# Altium footprint library 14-Inductors.PcbLib: 164 footprints (part 7 of 11) (continued)
## IND_WURTH_WE-CMB-XXL [mm] "WURTH Common Mode Choke WE-CMB XXL Serie" (continued)
  text "4" at -5.3,12.15 h1.5
  text "3" at 4.7,12.15 h1.5
  text "2" at 4.8,-13.6 h1.5
  text "1" at -5.2,-13.6 h1.5
3D body "IND_WURTH_WE-CMB-XXL.stp": height 39.4, standoff -5, extent -19.6,-11.5 19.6,11.5

## IND_WURTH_WE-DD_7332 [mm] "Power Choke, WE-DD Serie, Body 7.7x7.7mm"
height 4
pads (4):
  rect 2.2x1 smd: 1(-2.65,-0.9) 2(2.65,-0.9) 3(2.65,0.9) 4(-2.65,0.9)
Top Overlay:
  circle w0.2: c-1.05,-1.4 r0.1
  lines w0.2: -3.85,-1.75 -3.85,-3.35 ccw(c-3.35,-3.35) -3.35,-3.85 3.35,-3.85 ccw(c3.35,-3.35) 3.85,-3.35 3.85,-1.75 ; -3.85,1.75 -3.85,3.35 cw(c-3.35,3.35) -3.35,3.85 3.35,3.85 cw(c3.35,3.35) 3.85,3.35 3.85,1.75 ; -2.855,-1.75 -2.951,-1.875 ccw(c-2.872,-1.936) -2.943,-2.007 -2.007,-2.943 ccw(c-1.936,-2.872) -1.875,-2.951 -1.322,-2.525 ; -2.855,1.75 -2.951,1.875 cw(c-2.872,1.936) -2.943,2.007 -2.007,2.943 cw(c-1.936,2.872) -1.875,2.951 -1.322,2.525 ; -1.855,-1.75 ccw(c0,0) 1.855,-1.75 ; -1.855,1.75 cw(c0,0) 1.855,1.75 ; -1.322,-2.18 -1.322,-2.525 ; -1.322,2.18 -1.322,2.525 ; -1.2,-0.9 -1.05,-0.9 cw(c-0.7,-0.9) -0.35,-0.9 cw(c0,-0.9) 0.35,-0.9 cw(c0.7,-0.9) 1.05,-0.9 1.2,-0.9 ; -1.2,0.9 -1.05,0.9 ccw(c-0.7,0.9) -0.35,0.9 ccw(c0,0.9) 0.35,0.9 ccw(c0.7,0.9) 1.05,0.9 1.2,0.9 ; -1.05,-0.2 -0.75,-0.2 ; -1.05,0.2 -0.75,0.2 ; -0.45,-0.2 -0.15,-0.2 ; -0.45,0.2 -0.15,0.2 ; 0.15,-0.2 0.45,-0.2 ; 0.15,0.2 0.45,0.2 ; 0.75,-0.2 1.05,-0.2 ; 0.75,0.2 1.05,0.2 ; 1.322,-2.18 1.322,-2.525 ; 1.322,2.18 1.322,2.525 ; 2.855,-1.75 2.951,-1.875 cw(c2.872,-1.936) 2.943,-2.007 2.007,-2.943 cw(c1.936,-2.872) 1.875,-2.951 1.322,-2.525 ; 2.855,1.75 2.951,1.875 ccw(c2.872,1.936) 2.943,2.007 2.007,2.943 ccw(c1.936,2.872) 1.875,2.951 1.322,2.525 ; -1.322,-2.525 ccw(c0,0) 1.322,-2.525 ; -1.322,2.525 cw(c0,0) 1.322,2.525
Mechanical 8:
  lines w0.05: -2.65,-1.4 -2.65,-0.9 -2.15,-0.9 ; -2.65,0.4 -2.65,0.9 -2.15,0.9 ; 0,-0.5 0,0 0.5,0 ; 2.65,-1.4 2.65,-0.9 3.15,-0.9 ; 2.65,0.4 2.65,0.9 3.15,0.9
Mechanical 14:
  circle w0.1: c0,0 r2.65
  circle w0.1: c-1.5,-1.5 r0.25
  lines w0.1: -2.296,-1.322 -2.525,-1.322 ; -2.296,1.322 -2.525,1.322 ; -1.322,-2.296 -1.322,-2.525 ; -1.322,2.296 -1.322,2.525 ; -1.2,-0.9 -1.05,-0.9 cw(c-0.7,-0.9) -0.35,-0.9 cw(c0,-0.9) 0.35,-0.9 cw(c0.7,-0.9) 1.05,-0.9 1.2,-0.9 ; -1.2,0.9 -1.05,0.9 ccw(c-0.7,0.9) -0.35,0.9 ccw(c0,0.9) 0.35,0.9 ccw(c0.7,0.9) 1.05,0.9 1.2,0.9 ; -1.05,-0.2 -0.75,-0.2 ; -1.05,0.2 -0.75,0.2 ; -0.45,-0.2 -0.15,-0.2 ; -0.45,0.2 -0.15,0.2 ; 0.15,-0.2 0.45,-0.2 ; 0.15,0.2 0.45,0.2 ; 0.75,-0.2 1.05,-0.2 ; 0.75,0.2 1.05,0.2 ; 1.322,-2.296 1.322,-2.525 ; 1.322,2.296 1.322,2.525 ; 2.296,-1.322 2.525,-1.322 ; 2.296,1.322 2.525,1.322 ; -2.525,-1.322 cw(c0,0) -2.525,1.322 ; -2.525,-1.322 -2.951,-1.875 ccw(c-2.872,-1.936) -2.943,-2.007 -2.007,-2.943 ccw(c-1.936,-2.872) -1.875,-2.951 -1.322,-2.525 ; -2.525,1.322 -2.951,1.875 cw(c-2.872,1.936) -2.943,2.007 -2.007,2.943 cw(c-1.936,2.872) -1.875,2.951 -1.322,2.525 ; -1.322,-2.525 ccw(c0,0) 1.322,-2.525 ; -1.322,2.525 cw(c0,0) 1.322,2.525 ; 1.322,-2.525 1.875,-2.951 ccw(c1.936,-2.872) 2.007,-2.943 2.943,-2.007 ccw(c2.872,-1.936) 2.951,-1.875 2.525,-1.322 ; 1.322,2.525 1.875,2.951 cw(c1.936,2.872) 2.007,2.943 2.943,2.007 cw(c2.872,1.936) 2.951,1.875 2.525,1.322 ; 2.525,-1.322 ccw(c0,0) 2.525,1.322 ; -3.85,-3.35 ccw(c-3.35,-3.35) -3.35,-3.85 3.35,-3.85 ccw(c3.35,-3.35) 3.85,-3.35 3.85,3.35 ccw(c3.35,3.35) 3.35,3.85 -3.35,3.85 ccw(c-3.35,3.35) -3.85,3.35 -3.85,-3.35
Mechanical 15:
  lines w0.05: -0.3,0 0.3,0 ; 0,-0.3 0,0.3 ; -4.1,-4.1 -4.1,4.1 4.1,4.1 4.1,-4.1 -4.1,-4.1
3D body "IND_WURTH_WE-DD-7332.stp": height 4, standoff 0, extent -3.65,-3.65 3.65,3.65

## IND_WURTH_WE-PD3_S [mm] "SMD Power Choke, Width 4.45mm Body Lenght 6.6mm Height 2.92mm, WURTH WE-PD3 Serie"
height 2.92
pads (2):
  rect 1.4x3.56 smd: 1(-2.725,0) 2(2.725,0)
Top Overlay:
  lines w0.2: -1.73,-1.993 -1.462,-2.225 1.462,-2.225 1.73,-1.993 ; -1.73,-1.19 ccw(c0,0) 1.73,-1.19 ; -1.73,-0.497 ccw(c0,0) 1.73,-0.497 ; -1.73,0.497 cw(c0,0) 1.73,0.497 ; -1.73,1.19 cw(c0,0) 1.73,1.19 ; -1.73,1.993 -1.462,2.225 1.462,2.225 1.73,1.993
Mechanical 8:
  lines w0.1: -3.23,0 -2.73,0 ; -2.73,-0.5 -2.73,0 ; -2.73,0.5 -2.73,0 ; -2.23,0 -2.73,0 ; -0.5,0 0,0 ; 0,-0.5 0,0 ; 0,0.5 0,0 ; 0.5,0 0,0 ; 2.23,0 2.73,0 ; 2.73,-0.5 2.73,0 ; 2.73,0.5 2.73,0 ; 3.23,0 2.73,0
Mechanical 14:
  circle w0.1: c0,0 r1.8
  circle w0.1: c0,0 r1.9
  circle w0.1: c0,0 r2.1
  lines w0.1: -2.3,-1.5 -1.462,-2.225 1.462,-2.225 2.3,-1.5 ; -2.3,-1.5 -2.3,1.5 ; -2.3,-1.5 -3.3,-0.635 -3.3,0.635 -2.3,1.5 ; -2.3,1.5 -1.462,2.225 1.462,2.225 2.3,1.5 ; 2.3,-1.5 3.3,-0.635 3.3,0.635 2.3,1.5 ; 2.3,-1.5 2.3,1.5
Mechanical 15:
  lines w0.05: -3.68,-2.475 3.68,-2.475 3.68,2.475 -3.68,2.475 -3.68,-2.475
3D body "IND_WURTH_WE-PD3-S.stp": height 2.92, standoff 0, extent -3.3,-2.225 3.3,2.225

## IND_WURTH_WE-PD4_L [mm] "SMD Power Choke, Width 10mm Body Lenght 12.7mm Height 5.3mm, WURTH WE-PD 4 Serie Type L"
height 5.3
pads (2):
  rect 3x2.8 smd: 1(-5.15,0) 2(5.15,0)
Top Overlay:
  circle w0.2: c-2.5,0 r0.35
  lines w0.2: -5.948,-1.8 -2.99,-4.007 ccw(c0,0) 2.99,-4.007 5.948,-1.8 ; -5.948,1.8 -2.99,4.007 cw(c0,0) 2.99,4.007 5.948,1.8 ; -3.811,-1.8 ccw(c0,0) 3.811,-1.8 ; -3.811,1.8 cw(c0,0) 3.811,1.8
Mechanical 8:
  lines w0.1: -5.65,0 -5.15,0 ; -5.15,-0.5 -5.15,0 ; -5.15,0.5 -5.15,0 ; -4.65,0 -5.15,0 ; -0.5,0 0,0 ; 0,-0.5 0,0 ; 0,0.5 0,0 ; 0.5,0 0,0 ; 4.65,0 5.15,0 ; 5.15,-0.5 5.15,0 ; 5.15,0.5 5.15,0 ; 5.65,0 5.15,0 ; -6.65,-1.4 -3.65,-1.4 -3.65,1.4 -6.65,1.4 -6.65,-1.4 ; 3.65,-1.4 6.65,-1.4 6.65,1.4 3.65,1.4 3.65,-1.4
Mechanical 14:
  circle w0.1: c-2.5,0 r0.35
  circle w0.1: c0,0 r4.215
  lines w0.1: -6.2,-1 -6.2,1 ; -4.196,-0.4 -3.815,-0.4 ccw(c-3.815,0) -3.815,0.4 -4.196,0.4 ; -4.095,-1 -6.35,-1 -6.35,-1.5 -2.99,-4.007 ccw(c0,0) 2.99,-4.007 6.35,-1.5 6.35,-1 4.095,-1 ; -4.095,1 -6.35,1 -6.35,1.5 -2.99,4.007 cw(c0,0) 2.99,4.007 6.35,1.5 6.35,1 4.095,1 ; 4.196,-0.4 3.815,-0.4 cw(c3.815,0) 3.815,0.4 4.196,0.4 ; 6.2,-1 6.2,1
Mechanical 15:
  lines w0.1: -6.9,-1.65 -6.567,-1.65 -3.14,-4.208 ccw(c0,0) 3.14,-4.208 6.567,-1.65 6.9,-1.65 6.9,1.65 6.567,1.65 3.14,4.208 ccw(c0,0) -3.14,4.208 -6.567,1.65 -6.9,1.65 -6.9,-1.65
3D body "IND_WURTH_WE-PD4-L.stp": height 5, standoff 0, extent -6.35,-5 6.35,5

## IND_WURTH_WE-PD4_XL [mm] "SMD Power Choke, Body Width 15mm Body Lenght 15mm Height 7.8mm, WURTH WE-PD 4 Serie Type XL"
height 7.8
pads (2):
  rect 4x9 smd: 1(-8.75,0) 2(8.75,0)
Top Overlay:
  circle w0.2: c-2.395,-2.099 r0.5
  circle w0.2: c0,0 r6.35
  lines w0.2: -6.214,-4.9 -2.552,-7.464 ccw(c-2.437,-7.3) -2.437,-7.5 2.437,-7.5 ccw(c2.437,-7.3) 2.552,-7.464 6.214,-4.9 ; -6.214,4.9 -2.552,7.464 cw(c-2.437,7.3) -2.437,7.5 2.437,7.5 cw(c2.437,7.3) 2.552,7.464 6.214,4.9
Mechanical 8:
  lines w0.1: -9.25,0 -8.75,0 ; -8.75,-0.5 -8.75,0 ; -8.75,0.5 -8.75,0 ; -8.25,0 -8.75,0 ; -0.5,0 0,0 ; 0,-0.5 0,0 ; 0,0.5 0,0 ; 0.5,0 0,0 ; 8.25,0 8.75,0 ; 8.75,-0.5 8.75,0 ; 8.75,0.5 8.75,0 ; 9.25,0 8.75,0 ; -10.75,-4.5 -6.75,-4.5 -6.75,4.5 -10.75,4.5 -10.75,-4.5 ; 6.75,-4.5 10.75,-4.5 10.75,4.5 6.75,4.5 6.75,-4.5
Mechanical 14:
  circle w0.1: c-2.395,-2.099 r0.5
  circle w0.1: c0,0 r6.75
  lines w0.1: -9.8,-3 -10,-3 -10,-3.5 cw(c-10.5,-3.5) -11,-3.5 -11,-2.2 cw(c-10.5,-2.2) -10.852,-1.845 -10.059,-1.059 ccw(c-10.2,-0.917) -10,-0.917 -10,0.917 ccw(c-10.2,0.917) -10.059,1.059 -10.852,1.845 cw(c-10.5,2.2) -11,2.2 -11,3.5 cw(c-10.5,3.5) -10,3.5 -10,3 -9.8,3 ; -7.5,-3.896 ccw(c-7.3,-3.896) -7.415,-4.06 -2.552,-7.464 ccw(c-2.437,-7.3) -2.437,-7.5 2.437,-7.5 ccw(c2.437,-7.3) 2.552,-7.464 7.415,-4.06 ccw(c7.3,-3.896) 7.5,-3.896 ; -7.5,3.896 cw(c-7.3,3.896) -7.415,4.06 -2.552,7.464 cw(c-2.437,7.3) -2.437,7.5 2.437,7.5 cw(c2.437,7.3) 2.552,7.464 7.415,4.06 cw(c7.3,3.896) 7.5,3.896 ; 9.8,-3 10,-3 10,-3.5 ccw(c10.5,-3.5) 11,-3.5 11,-2.2 ccw(c10.5,-2.2) 10.852,-1.845 10.059,-1.059 cw(c10.2,-0.917) 10,-0.917 10,0.917 cw(c10.2,0.917) 10.059,1.059 10.852,1.845 ccw(c10.5,2.2) 11,2.2 11,3.5 ccw(c10.5,3.5) 10,3.5 10,3 9.8,3 ; -9.8,-4 -9.8,4 -7.5,4 -7.5,-4 -9.8,-4 ; 7.5,-4 7.5,4 9.8,4 9.8,-4 7.5,-4
Mechanical 15:
  lines w0.1: -11.25,-4.75 -6.865,-4.75 -2.579,-7.75 2.579,-7.75 6.865,-4.75 11.25,-4.75 11.25,4.75 6.865,4.75 2.579,7.75 -2.579,7.75 -6.865,4.75 -11.25,4.75 -11.25,-4.75
3D body "IND_WURTH_WE-PD4-XL.stp": height 7, standoff 0, extent -11,-7.5 11,7.5

## IND_WURTH_WE-PD-XSH [mm] "Power-Choke Inductor, Body 6.2x5.9mm, WURTH WE-PD Serie Type XSH"
height 5.1
pads (2):
  rect 1.85x1.9 smd: 1(-2.175,0) 2(2.175,0)
Top Overlay:
  lines w0.2: -2.95,-1.3 -2.95,-1.8 ccw(c-1.65,-1.8) -1.65,-3.1 1.65,-3.1 ccw(c1.65,-1.8) 2.95,-1.8 2.95,-1.3 ; -2.95,1.3 -2.95,1.8 cw(c-1.65,1.8) -1.65,3.1 1.65,3.1 cw(c1.65,1.8) 2.95,1.8 2.95,1.3
Mechanical 8:
  lines w0.1: -2.675,0 -2.175,0 ; -2.175,-0.5 -2.175,0 ; -2.175,0.5 -2.175,0 ; -1.675,0 -2.175,0 ; -0.5,0 0,0 ; 0,-0.5 0,0 ; 0,0.5 0,0 ; 0.5,0 0,0 ; 1.675,0 2.175,0 ; 2.175,-0.5 2.175,0 ; 2.175,0.5 2.175,0 ; 2.675,0 2.175,0 ; -3.1,-0.95 -1.25,-0.95 -1.25,0.95 -3.1,0.95 -3.1,-0.95 ; 1.25,-0.95 3.1,-0.95 3.1,0.95 1.25,0.95 1.25,-0.95
Mechanical 14:
  lines w0.1: -2.95,-1.8 ccw(c-1.65,-1.8) -1.65,-3.1 1.65,-3.1 ccw(c1.65,-1.8) 2.95,-1.8 2.95,1.8 ccw(c1.65,1.8) 1.65,3.1 -1.65,3.1 ccw(c-1.65,1.8) -2.95,1.8 -2.95,-1.8
Mechanical 15:
  lines w0.05: -3.35,-3.35 3.35,-3.35 3.35,3.35 -3.35,3.35 -3.35,-3.35
3D body "IND_WURTH_WE-PD-XSH.stp": height 5.1, standoff 0, extent -2.95,-3.1 2.95,3.1

## IND_WURTH_WE-PD_7332(METAL) [mm] "Power Choke, WE-PD Serie, Body 7.3x7.3mm (Metal Base)"
height 3.4
pads (2):
  rect 1.6x2.2 smd: 1(-3.2,0) 2(3.2,0)
Top Overlay:
  circle w0.2: c-2.35,2.35 r0.4
  lines w0.2: -3.65,-1.5 -3.65,-2.35 ccw(c-2.35,-2.35) -2.35,-3.65 2.35,-3.65 ccw(c2.35,-2.35) 3.65,-2.35 3.65,-1.5 ; -3.65,1.5 -3.65,2.35 cw(c-2.35,2.35) -2.35,3.65 2.35,3.65 cw(c2.35,2.35) 3.65,2.35 3.65,1.5
Mechanical 8:
  lines w0.1: -3.7,0 -3.2,0 ; -3.2,-0.5 -3.2,0 ; -3.2,0.5 -3.2,0 ; -2.7,0 -3.2,0 ; -0.5,0 0,0 ; 0,-0.5 0,0 ; 0,0.5 0,0 ; 0.5,0 0,0 ; 2.7,0 3.2,0 ; 3.2,-0.5 3.2,0 ; 3.2,0.5 3.2,0 ; 3.7,0 3.2,0 ; -2.4,-1.1 -2.4,1.1 ; -2.4,-1.1 -2.4,1.1 ; -2.4,-1.1 -4,-1.1 -4,1.1 -2.4,1.1 ; 4,-1.1 4,1.1 ; 4,-1.1 4,1.1 ; 4,-1.1 2.4,-1.1 2.4,1.1 4,1.1
Mechanical 14:
  circle w0.1: c-2.35,2.35 r0.4
  lines w0.1: -3.65,-2.35 ccw(c-2.35,-2.35) -2.35,-3.65 2.35,-3.65 ccw(c2.35,-2.35) 3.65,-2.35 3.65,2.35 ccw(c2.35,2.35) 2.35,3.65 -2.35,3.65 ccw(c-2.35,2.35) -3.65,2.35 -3.65,-2.35
Mechanical 15:
  lines w0.05: -4.25,-3.9 4.25,-3.9 4.25,3.9 -4.25,3.9 -4.25,-3.9
3D body "IND_WURTH_WE-PD_7332(METAL).stp": height 3.4, standoff 0, extent -3.65,-3.65 3.65,3.65

## IND_WURTH_WE-PD_XXL [mm] "Power-Choke Inductor, Body 12x12mm, WURTH WE-PD Serie Type XXL"
height 10
pads (2):
  rect 2.9x5.4 smd: 1(-4.95,0) 2(4.95,0)
Top Overlay:
  circle w0.2: c-2.51,-2.86 r0.4
  lines w0.2: -6.25,-3 -6.25,-5.25 ccw(c-5.25,-5.25) -5.25,-6.25 5.25,-6.25 ccw(c5.25,-5.25) 6.25,-5.25 6.25,-3 ; -6.25,3 -6.25,5.25 cw(c-5.25,5.25) -5.25,6.25 5.25,6.25 cw(c5.25,5.25) 6.25,5.25 6.25,3 ; -5.113,-3 ccw(c-3.96,-3.96) -2.767,-4.869 ; -5.113,3 cw(c-3.96,3.96) -2.767,4.869 ; -4.729,-3 ccw(c0,0) 4.729,-3 ; -4.729,3 cw(c0,0) 4.729,3 ; -4.369,-3 ccw(c0,0) 4.369,-3 ; -4.369,3 cw(c0,0) 4.369,3 ; 2.767,-4.869 ccw(c3.96,-3.96) 5.113,-3 ; 2.767,4.869 cw(c3.96,3.96) 5.113,3
Mechanical 8:
  lines w0.1: -5.45,0 -4.95,0 ; -4.95,-0.5 -4.95,0 ; -4.95,0.5 -4.95,0 ; -4.45,0 -4.95,0 ; -0.5,0 0,0 ; 0,-0.5 0,0 ; 0,0.5 0,0 ; 0.5,0 0,0 ; 4.45,0 4.95,0 ; 4.95,-0.5 4.95,0 ; 4.95,0.5 4.95,0 ; 5.45,0 4.95,0 ; -3.5,-2.7 -6.4,-2.7 -6.4,2.7 -3.5,2.7 ; -3.5,-2.7 -3.5,2.7 ; -3.5,-2.7 -3.5,2.7 ; 3.5,-2.7 3.5,2.7 ; 3.5,-2.7 6.4,-2.7 6.4,2.7 3.5,2.7 ; 3.5,-2.7 3.5,2.7
Mechanical 14:
  circle w0.1: c0,0 r5.6
  circle w0.1: c0,0 r5.3
  circle w0.1: c-2.51,-2.86 r0.4
  lines w0.1: -4.869,-2.767 ccw(c-3.96,-3.96) -2.767,-4.869 ; -4.869,2.767 cw(c-3.96,3.96) -2.767,4.869 ; 2.767,-4.869 ccw(c3.96,-3.96) 4.869,-2.767 ; 2.767,4.869 cw(c3.96,3.96) 4.869,2.767 ; -6.25,-5.25 ccw(c-5.25,-5.25) -5.25,-6.25 5.25,-6.25 ccw(c5.25,-5.25) 6.25,-5.25 6.25,5.25 ccw(c5.25,5.25) 5.25,6.25 -5.25,6.25 ccw(c-5.25,5.25) -6.25,5.25 -6.25,-5.25
Mechanical 15:
  lines w0.1: -6.65,-6.5 6.65,-6.5 6.65,6.5 -6.65,6.5 -6.65,-6.5
3D body "IND_WURTH_WE-PD-XXL.stp": height 10, standoff 0, extent -6.25,-6.25 6.25,6.25

## IND_WURTH_WE-PMI-0805 [mm] "Chip Inductor, EIA 0805, Metric 2012, Body 2.0x1.2mm, WE-PMI Serie"
height 1.2
pads (2):
  rect 0.7x1.45 smd: 1(-0.75,0) 2(0.75,0)
Top Overlay:
  lines w0.2: 0,-0.6 0,0.6
Mechanical 8:
  lines w0.1: -1.25,0 -0.75,0 ; -0.75,-0.5 -0.75,0 ; -0.75,0.5 -0.75,0 ; -0.5,0 0,0 ; 0,-0.5 0,0 ; 0,0.5 0,0 ; 0.5,0 0,0 ; 0.75,-0.5 0.75,0 ; 0.75,0.5 0.75,0 ; 1.25,0 0.75,0 ; -1.1,-0.725 -0.4,-0.725 -0.4,0.725 -1.1,0.725 -1.1,-0.725 ; 0.4,-0.725 1.1,-0.725 1.1,0.725 0.4,0.725 0.4,-0.725
Mechanical 14:
  lines w0.1: -1,-0.6 1,-0.6 1,0.6 -1,0.6 -1,-0.6
Mechanical 15:
  lines w0.05: -1.35,-0.975 1.35,-0.975 1.35,0.975 -1.35,0.975 -1.35,-0.975
3D body "IND_WURTH_WE-PMI-0805.stp": height 1, standoff 0, extent -1,-0.6 1,0.6

## IND_WURTH_WE-SD_744711015 [mm] "WURTH Filter Choke WE-SD Serie"
height 16
pads (2):
  round 2.7 hole 2: 1(-14.6,7.15) 2(14.6,-7.15)
Top Overlay:
  lines w0.2: -15.4,5.594 -15.4,-6 -14.241,-6 ; -14.978,5.441 -14.167,-7.148 ccw(c-13.317,-7.15) -12.469,-7.089 ; -13.357,5.918 -12.468,-7.095 ; -13.013,7.888 cw(c-12.591,7.15) -11.741,7.15 -10.768,-7.095 ; -12.467,-7.15 ccw(c-11.617,-7.15) -10.769,-7.089 ; -11.733,7.032 cw(c-10.891,7.15) -10.041,7.15 -9.068,-7.095 ; -10.767,-7.15 ccw(c-9.917,-7.15) -9.069,-7.089 ; -10.033,7.032 cw(c-9.191,7.15) -8.341,7.15 -7.368,-7.095 ; -9.067,-7.15 ccw(c-8.217,-7.15) -7.369,-7.089 ; -8.302,7.032 cw(c-7.46,7.151) -6.61,7.151 -5.638,-7.095 ; -7.336,-7.149 ccw(c-6.486,-7.149) -5.638,-7.088 ; -6.602,7.032 cw(c-5.76,7.151) -4.91,7.151 -3.938,-7.095 ; -5.636,-7.149 ccw(c-4.786,-7.149) -3.938,-7.088 ; -4.902,7.032 cw(c-4.06,7.151) -3.21,7.151 -2.238,-7.095 ; -3.936,-7.149 ccw(c-3.086,-7.149) -2.238,-7.088 ; -3.202,7.032 cw(c-2.36,7.151) -1.51,7.151 -0.538,-7.095 ; -2.236,-7.149 ccw(c-1.386,-7.149) -0.538,-7.088 ; -1.502,7.032 cw(c-0.66,7.151) 0.19,7.151 1.162,-7.095 ; -0.536,-7.149 ccw(c0.314,-7.149) 1.162,-7.088 ; 0.198,7.032 cw(c1.04,7.151) 1.89,7.151 2.862,-7.095 ; 1.164,-7.149 ccw(c2.014,-7.149) 2.862,-7.088 ; 1.898,7.032 cw(c2.74,7.151) 3.59,7.151 4.562,-7.095 ; 2.864,-7.149 ccw(c3.714,-7.149) 4.562,-7.088 ; 3.629,7.033 cw(c4.47,7.151) 5.32,7.151 6.293,-7.094 ; 4.595,-7.149 ccw(c5.445,-7.149) 6.292,-7.088 ; 5.329,7.033 cw(c6.17,7.151) 7.02,7.151 7.993,-7.094 ; 6.295,-7.149 ccw(c7.145,-7.149) 7.992,-7.088 ; 7.029,7.033 cw(c7.87,7.151) 8.72,7.151 9.693,-7.094 ; 7.995,-7.149 ccw(c8.845,-7.149) 9.692,-7.088 ; 8.729,7.033 cw(c9.57,7.151) 10.42,7.151 11.393,-7.094 ; 9.695,-7.149 ccw(c10.545,-7.149) 11.392,-7.088 ; 10.429,7.033 cw(c11.27,7.151) 12.12,7.151 13.042,-6.353 ; 11.395,-7.149 ccw(c12.245,-7.149) 12.925,-7.658 ; 12.129,7.033 cw(c12.97,7.151) 13.82,7.151 14.698,-5.403 ; 13.901,6 15.4,6 15.4,-5.594
Mechanical 8:
  lines w0.1: -15.1,7.15 -14.6,7.15 ; -14.6,6.65 -14.6,7.15 ; -14.6,7.65 -14.6,7.15 ; -14.1,7.15 -14.6,7.15 ; -0.5,0 0,0 ; 0,-0.5 0,0 ; 0,0.5 0,0 ; 0.5,0 0,0 ; 14.1,-7.15 14.6,-7.15 ; 14.6,-7.65 14.6,-7.15 ; 14.6,-6.65 14.6,-7.15 ; 15.1,-7.15 14.6,-7.15
Mechanical 14:
  lines w0.1: -15.014,6 -15.4,6 -15.4,-6 -14.241,-6 ; -13.393,6.454 -13.814,7.474 ccw(c-14.6,7.15) -15.337,6.727 -15.026,6.184 -14.167,-7.148 ccw(c-13.317,-7.15) -12.469,-7.089 ; -12.468,-7.095 -13.433,7.032 cw(c-12.591,7.15) -11.741,7.15 -10.768,-7.095 ; -12.467,-7.15 ccw(c-11.617,-7.15) -10.769,-7.089 ; -11.733,7.032 cw(c-10.891,7.15) -10.041,7.15 -9.068,-7.095 ; -10.767,-7.15 ccw(c-9.917,-7.15) -9.069,-7.089 ; -10.033,7.032 cw(c-9.191,7.15) -8.341,7.15 -7.368,-7.095 ; -9.067,-7.15 ccw(c-8.217,-7.15) -7.369,-7.089 ; -8.302,7.032 cw(c-7.46,7.151) -6.61,7.151 -5.638,-7.095 ; -7.336,-7.149 ccw(c-6.486,-7.149) -5.638,-7.088 ; -6.602,7.032 cw(c-5.76,7.151) -4.91,7.151 -3.938,-7.095 ; -5.636,-7.149 ccw(c-4.786,-7.149) -3.938,-7.088 ; -4.902,7.032 cw(c-4.06,7.151) -3.21,7.151 -2.238,-7.095 ; -3.936,-7.149 ccw(c-3.086,-7.149) -2.238,-7.088 ; -3.202,7.032 cw(c-2.36,7.151) -1.51,7.151 -0.538,-7.095 ; -2.236,-7.149 ccw(c-1.386,-7.149) -0.538,-7.088 ; -1.502,7.032 cw(c-0.66,7.151) 0.19,7.151 1.162,-7.095 ; -0.536,-7.149 ccw(c0.314,-7.149) 1.162,-7.088 ; 0.198,7.032 cw(c1.04,7.151) 1.89,7.151 2.862,-7.095 ; 1.164,-7.149 ccw(c2.014,-7.149) 2.862,-7.088 ; 1.898,7.032 cw(c2.74,7.151) 3.59,7.151 4.562,-7.095 ; 2.864,-7.149 ccw(c3.714,-7.149) 4.562,-7.088 ; 3.629,7.033 cw(c4.47,7.151) 5.32,7.151 6.293,-7.094 ; 4.595,-7.149 ccw(c5.445,-7.149) 6.292,-7.088 ; 5.329,7.033 cw(c6.17,7.151) 7.02,7.151 7.993,-7.094 ; 6.295,-7.149 ccw(c7.145,-7.149) 7.992,-7.088 ; 7.029,7.033 cw(c7.87,7.151) 8.72,7.151 9.693,-7.094 ; 7.995,-7.149 ccw(c8.845,-7.149) 9.692,-7.088 ; 8.729,7.033 cw(c9.57,7.151) 10.42,7.151 11.393,-7.094 ; 9.695,-7.149 ccw(c10.545,-7.149) 11.392,-7.088 ; 10.429,7.033 cw(c11.27,7.151) 12.12,7.151 13.092,-7.088 cw(c12.245,-7.149) 11.395,-7.149 ; 12.129,7.033 cw(c12.97,7.151) 13.82,7.151 14.739,-6 ; 13.063,-6.651 13.952,-7.7 ccw(c14.6,-7.15) 15.248,-6.6 14.739,-6 ; 13.901,6 15.4,6 15.4,-6 14.739,-6
3D body "IND_WURTH_WE-SD_744711015.stp": height 16, standoff -3, extent -15.449,-8 15.449,8

## IND_WURTH_WE-SL2 [mm] "Common Mode SMD Line Filter WE-SL2"
height 1.45
pads (4):
  rect 2x1.2 smd: 1(-3.75,1.27) 2(-3.75,-1.27) 3(3.75,-1.27) 4(3.75,1.27)
Top Overlay:
  circle w0.2: c-2.25,-0.75 r0.1
  circle w0.2: c-2.25,0.75 r0.1
  lines w0.2: -4.75,-2.175 -4.75,-3.15 4.75,-3.15 4.75,-2.175 ; -4.75,-0.365 -4.75,0.365 ; -4.75,2.175 -4.75,3.15 4.75,3.15 4.75,2.175 ; -2.25,-1.5 -1.905,-1.5 cw(c-1.27,-1.5) -0.635,-1.5 cw(c0,-1.5) 0.635,-1.5 cw(c1.27,-1.5) 1.905,-1.5 2.25,-1.5 ; -2.25,1.5 -1.905,1.5 ccw(c-1.27,1.5) -0.635,1.5 ccw(c0,1.5) 0.635,1.5 ccw(c1.27,1.5) 1.905,1.5 2.25,1.5 ; -1.75,-0.25 -1.25,-0.25 ; -1.75,0.25 -1.25,0.25 ; -0.75,-0.25 -0.25,-0.25 ; -0.75,0.25 -0.25,0.25 ; 0.25,-0.25 0.75,-0.25 ; 0.25,0.25 0.75,0.25 ; 1.25,-0.25 1.75,-0.25 ; 1.25,0.25 1.75,0.25 ; 4.75,-0.365 4.75,0.365
Mechanical 14:
  circle w0.1: c-2.25,-0.75 r0.1
  circle w0.1: c-2.25,0.75 r0.1
  lines w0.1: -2.25,-1.5 -1.905,-1.5 cw(c-1.27,-1.5) -0.635,-1.5 cw(c0,-1.5) 0.635,-1.5 cw(c1.27,-1.5) 1.905,-1.5 2.25,-1.5 ; -2.25,1.5 -1.905,1.5 ccw(c-1.27,1.5) -0.635,1.5 ccw(c0,1.5) 0.635,1.5 ccw(c1.27,1.5) 1.905,1.5 2.25,1.5 ; -1.75,-0.25 -1.25,-0.25 ; -1.75,0.25 -1.25,0.25 ; -0.75,-0.25 -0.25,-0.25 ; -0.75,0.25 -0.25,0.25 ; 0.25,-0.25 0.75,-0.25 ; 0.25,0.25 0.75,0.25 ; 1.25,-0.25 1.75,-0.25 ; 1.25,0.25 1.75,0.25 ; -4.75,-3.15 -4.75,3.15 4.75,3.15 4.75,-3.15 -4.75,-3.15
Mechanical 15:
  lines w0.05: -0.3,0 0.3,0 ; 0,-0.3 0,0.3 ; -5,-3.4 -5,3.4 5,3.4 5,-3.4 -5,-3.4
3D body "IND_WURTH_WE-SL2.stp": height 5.3, standoff 0, extent -4.749,-3.149 4.751,3.151

## IND_WURTH_WE-SUKW_7427511 [mm] "WE-SUKW SMD EMI Suppression 5-Hole Ferrite Bead, Body 8x5mm"
height 5.1
pads (2):
  rect 3x6 smd: 1(-2.5,0) 2(2.5,0)
Top Overlay:
  lines w0.2: -0.6,-2.5 0.6,-2.5 ; -0.6,2.5 0.6,2.5
Mechanical 8:
  lines w0.1: -3,0 -2.5,0 ; -2.5,-0.5 -2.5,0 ; -2.5,0.5 -2.5,0 ; -2,0 -2.5,0 ; -0.5,0 0,0 ; 0,-0.5 0,0 ; 0,0.5 0,0 ; 0.5,0 0,0 ; 2,0 2.5,0 ; 2.5,-0.5 2.5,0 ; 2.5,0.5 2.5,0 ; 3,0 2.5,0 ; -4,-3 -4,3 -1,3 -1,-3 -4,-3 ; 1,-3 1,3 4,3 4,-3 1,-3
Mechanical 14:
  drawing of 3064 lines, arcs and shapes, not listed
Mechanical 15:
  lines w0.05: -4.25,-3.25 4.25,-3.25 4.25,3.25 -4.25,3.25 -4.25,-3.25
3D body "IND_WURTH_WE-SUKW_7427511.stp": height 4.85, standoff 0, extent -4,-2.625 4,2.625

## IND_WURTH_WE-TI [mm] "Radial Leaded Wire Wound Inductor D=8.3mm"
height 10
pads (2):
  round 1.5 hole 1: 1(-2.54,0) 2(2.54,0)
Top Overlay:
  circle w0.2: c0,0 r4.15
Mechanical 14:
  circle w0.1: c0,0 r4.15
3D body "INDRD_WURTH_WE-TI.stp": height 10, standoff -3.6, extent -4.65,-4.65 4.65,4.65

## IND_WURTH_WE-TPC_4828 [mm] "Shielded Tiny Power Inductor, Body 4.8x4.8mm"
height 2.8
pads (2):
  rect 0.5x0.5 smd: 1(-2.247,0) 2(2.247,0)
Top Layer:
  region: -2.75,-2.65 -0.75,-2.65 -0.75,-1.636 -0.902,-1.558 -1.18,-1.359 -1.416,-1.112 -1.6,-0.824 -1.727,-0.507 -1.792,-0.171 -1.792,0.171 -1.727,0.507 -1.6,0.824 -1.416,1.112 -1.18,1.359 -0.902,1.558 -0.75,1.636 -0.75,2.65 -2.75,2.65
  region: 0.75,-2.65 2.75,-2.65 2.75,2.65 0.75,2.65 0.75,1.636 0.902,1.558 1.18,1.359 1.416,1.112 1.6,0.824 1.727,0.507 1.792,0.171 1.792,-0.171 1.727,-0.507 1.6,-0.824 1.416,-1.112 1.18,-1.359 0.902,-1.558 0.75,-1.636
Top Overlay:
  lines w0.1: -0.35,-2.4 0.35,-2.4 ; -0.35,2.4 0.35,2.4
Mechanical 8:
  lines w0.1: -2.747,0 -2.247,0 ; -2.247,-0.5 -2.247,0 ; -2.247,0.5 -2.247,0 ; -1.747,0 -2.247,0 ; -0.5,0 0,0 ; 0,-0.5 0,0 ; 0,0.5 0,0 ; 0.5,0 0,0 ; 1.747,0 2.247,0 ; 2.247,-0.5 2.247,0 ; 2.247,0.5 2.247,0 ; 2.747,0 2.247,0 ; -2.75,-2.65 -0.75,-2.65 -0.75,-1.636 cw(c0,0) -0.75,1.636 -0.75,2.65 -2.75,2.65 -2.75,-2.65 ; 0.75,-2.65 2.75,-2.65 2.75,2.65 0.75,2.65 0.75,1.636 cw(c0,0) 0.75,-1.636 0.75,-2.65
Mechanical 14:
  circle w0.1: c0,0 r1.744
  lines w0.1: -2.4,-2.4 -2.4,2.4 2.4,2.4 2.4,-2.4 -2.4,-2.4
Mechanical 15:
  lines w0.1: -3,-2.9 3,-2.9 3,2.9 -3,2.9 -3,-2.9
3D body "IND_WURTH_WE-TPC-4828.stp": height 2.8, standoff 0, extent -2.4,-2.4 2.4,2.4